# Altium footprint library 常用元件封装库.PcbLib: 1310 footprints (part 82 of 83)
Each footprint in its own frame and in the unit in brackets; x right, y up, seen from the top. Pads: shape width x height; smd on the part's side, far side on the other; paste and mask are expansions set on the pad; w line width, h text height; cw(c..) or ccw(c..) is an arc to the next point about the centre after c.
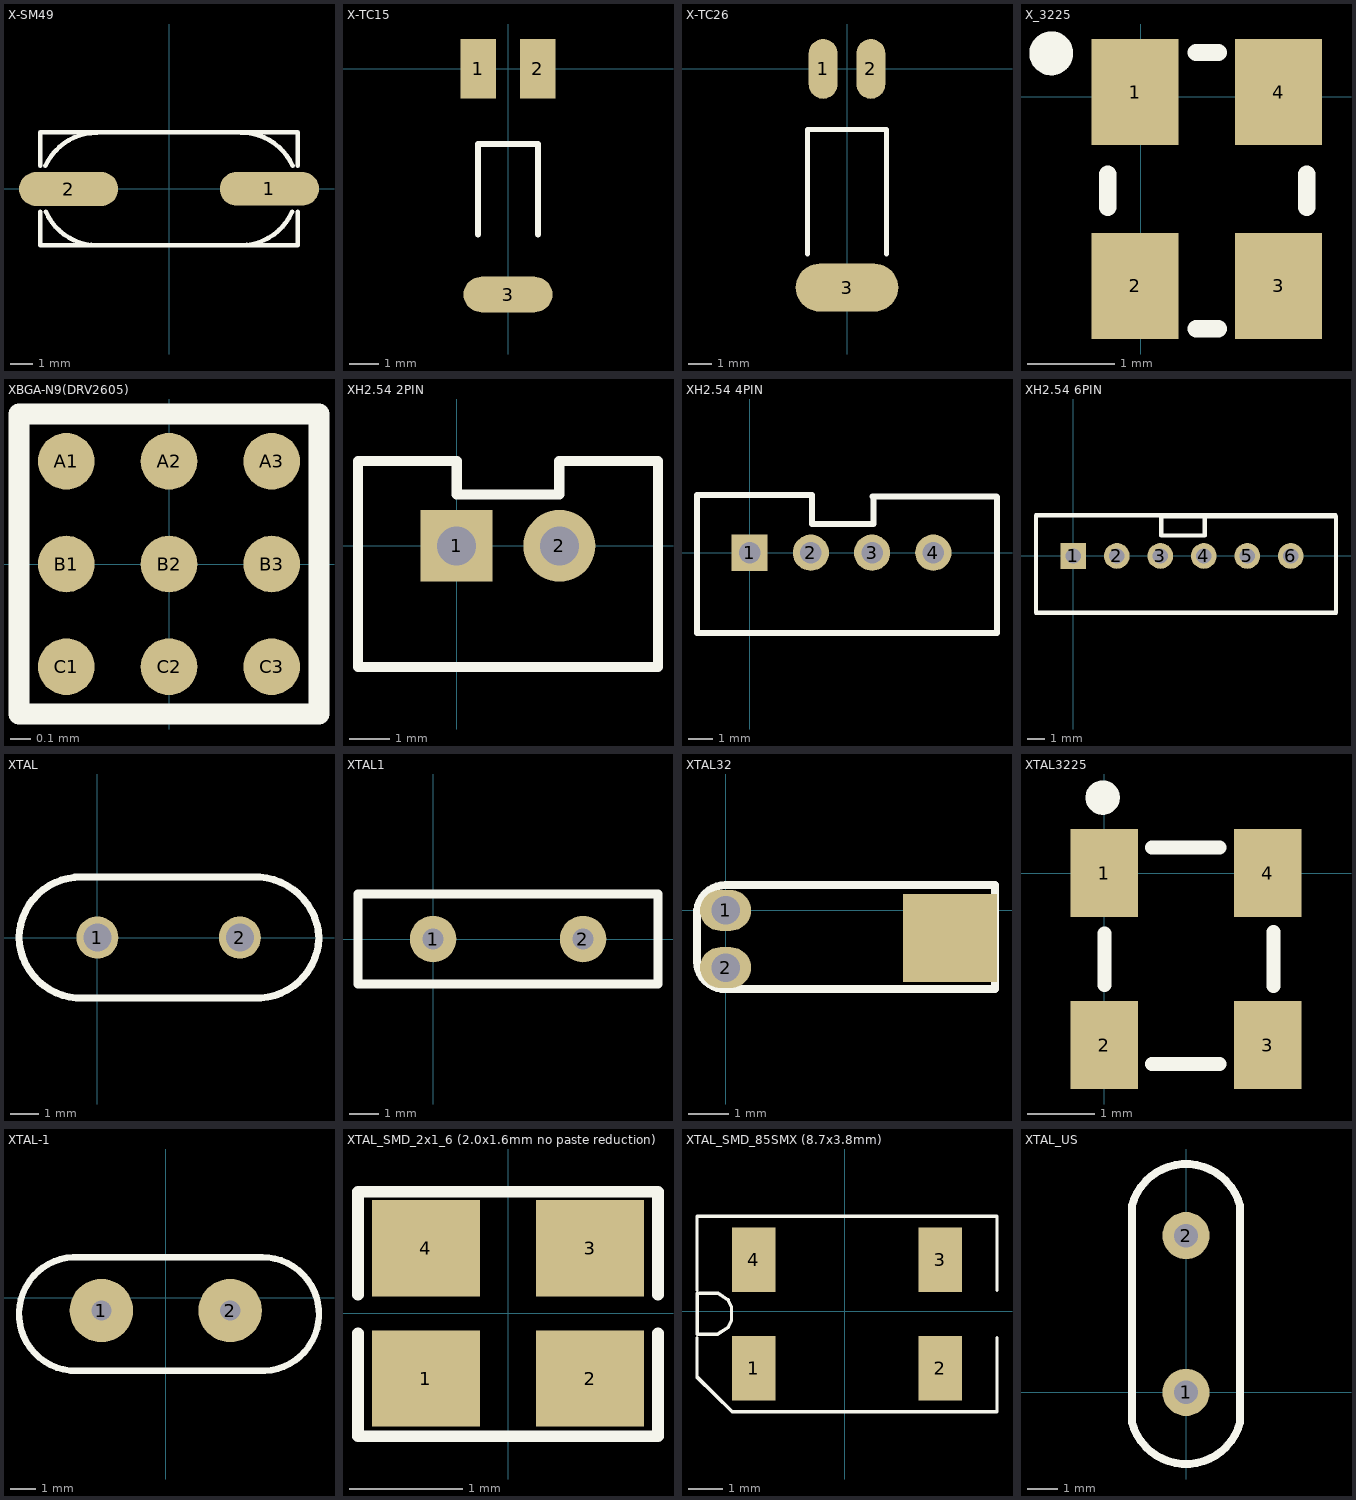
[diagram p81: the footprints below, top view; thin cyan lines are the x and y axes]

## X-SM49 [mm]
height 14.8
pads (2):
  oval 4.4x1.5 smd: 1(4.45,0.004) 2(-4.45,-0.004)
Top Overlay:
  lines w0.2: -5.7,-2.499 5.718,-2.499 ; -5.7,-2.496 -5.7,-1.016 ; -5.7,1.016 -5.7,2.504 5.718,2.504 5.718,1.016 ; -5.477,1.023 cw(c-3.202,-0.013) -3.175,2.487 ; -5.461,-1.016 ccw(c-3.176,-0.001) -3.176,-2.501 ; 3.175,-2.5 ccw(c3.175,0) 5.46,-1.015 ; 3.175,2.496 cw(c3.202,-0.004) 5.48,1.025 ; 5.718,-2.496 5.718,-1.016
3D body "User Library-HC-49S.STEP": height 4.3, standoff -0.05, extent -6.15,-2.35 6.15,2.35

## X-TC15 [mm] "圆柱晶振1"
pads (3):
  rect 1.2x2 smd: 1(-1,0) 2(1,0)
  oval 3x1.2 smd: 3(0,-7.62)
Top Overlay:
  lines w0.2: -1.016,-5.588 -1.016,-2.54 1.016,-2.54 1.016,-5.588
3D body: height 1.1, standoff 0.9, extent 0.535,-3 0.735,0
3D body: height 1.1, standoff 0.9, extent -0.735,-3 -0.535,0
3D body: height 1.99, standoff 0, extent -0.998,-8.286 0.998,-2.286

## X-TC26 [mm] "圆柱晶振2"
pads (3):
  oval 1.2x2.5 smd: 1(-1,0) 2(1,0)
  oval 4.3x2 smd: 3(0,-9.144)
Top Overlay:
  lines w0.2: -1.651,-7.747 -1.651,-2.54 1.651,-2.54 1.651,-7.747

## X_3225 [mil]
height 57.09
pads (4):
  rect 39.37x48 smd: 1(-2.6,2.09) 2(-2.6,-85.59) 3(62.36,-85.59) 4(62.36,2.09)
Top Overlay:
  circle w9.84: c-40.5,19.6 r5
  lines w7.87: -15,-50 -15,-35 ; 25,-105 35,-105 ; 25,20 35,20 ; 75,-50 75,-35

## XBGA-N9(DRV2605) [mm]
pads (9):
  round 0.275 smd: A1(-0.5,0.5) A2(0,0.5) A3(0.5,0.5) B1(-0.5,0) B2(0,0) B3(0.5,0) C1(-0.5,-0.5) C2(0,-0.5) C3(0.5,-0.5)
Top Overlay:
  lines w0.102: -0.73,-0.73 -0.73,0.73 0.73,0.73 0.73,-0.73 -0.73,-0.73

## XH2.54 2PIN [mil]
pads (2):
  rect 70x70 hole 38: 1(0,0)
  round 70 hole 38: 2(100,0)
Top Overlay:
  lines w10: 100,82.68 193,82.68 ; 100,82.68 100,50 0,50 0,82.68 -96.06,82.68 -96.06,-118.11 196.06,-118.11 196.06,82.68 ; 100,82.68 193,82.68 ; 193,82.68 196.06,82.68 ; 193,82.68 196.06,82.68
3D body "User Library-XH2_54_2PIN.STEP": height 275.59, standoff -157.48, extent -107.48,-122 207.48,114.22

## XH2.54 4PIN [mm]
pads (4):
  rect 1.5x1.5 hole 0.9: 1(0,0)
  round 1.5 hole 0.9: 2(2.54,0) 3(5.08,0) 4(7.62,0)
Top Overlay:
  lines w0.254: 5.105,2.329 7.468,2.329 ; 7.545,2.329 7.468,2.329 ; 10.236,2.329 7.468,2.329 ; 10.262,2.311 10.262,-3.327 -2.184,-3.327 -2.184,2.388 2.591,2.388 2.591,1.194 5.131,1.194 5.131,2.329 7.468,2.329
3D body "SW3dPS-jst-b4b-xh-a-1.STEP": height 7, standoff -3.4, extent -2.365,-3.459 10.035,2.291

## XH2.54 6PIN [mm]
pads (6):
  rect 1.5x1.5 hole 0.9: 1(0,0)
  round 1.5 hole 0.9: 2(2.54,0) 3(5.08,0) 4(7.62,0) 5(10.16,0) 6(12.7,0)
Top Overlay:
  lines w0.254: 2.896,-3.327 15.342,-3.327 15.342,2.311 ; 5.105,2.329 7.468,2.329 ; 5.131,2.388 5.131,1.194 7.671,1.194 7.671,2.329 ; 7.545,2.329 7.468,2.329 ; 10.185,2.329 12.548,2.329 ; 10.211,2.329 12.548,2.329 ; 10.236,2.329 7.468,2.329 ; 10.262,-3.327 -2.184,-3.327 -2.184,2.388 15.316,2.388 ; 12.625,2.329 12.548,2.329 ; 15.316,2.329 12.548,2.329
3D body "SW3dPS-jst-b4b-xh-a-1.STEP": height 7, standoff -3.4, extent -2.365,-3.459 10.035,2.291
3D body "SW3dPS-jst-b4b-xh-a-1.STEP": height 7, standoff -3.4, extent 2.715,-3.459 15.115,2.291

## XTAL [mm]
pads (2):
  round 1.5 hole 1.002: 1(0,0) 2(5.08,0)
Top Overlay:
  lines w0.254: -2.794,0 ccw(c-0.572,0.064) -0.508,-2.159 5.588,-2.159 ccw(c5.677,0.064) 7.899,-0.025 ccw(c5.626,-0.114) 5.537,2.159 -0.559,2.159 ccw(c-0.597,-0.038) -2.794,0

## XTAL1 [mil]
pads (2):
  round 62 hole 28: 1(0,0) 2(200,0)
Top Overlay:
  lines w12: -100,-60 -100,60 300,60 300,-60 -100,-60

## XTAL32 [mil]
pads (3):
  oval 50x40 hole 28: 1(0,0) 2(0,-56)
  rect 92.13x86 smd: ""(220,-27)
Top Overlay:
  lines w8: -28,-50 ccw(c-0.5,-49.5) 0,-77 264,-77 264,25 0,25 ccw(c0.5,-3.5) -28,-4 -28,-50

## XTAL3225 [mm]
pads (4):
  rect 1x1.3 smd: 1(0,0) 2(0,-2.54) 3(2.413,-2.54) 4(2.413,0)
Top Overlay:
  circle w0.254: c-0.025,1.118 r0.127
  lines w0.203: 0,-1.651 0,-0.889 ; 0.7,-2.819 1.7,-2.819 ; 0.7,0.381 1.7,0.381 ; 2.5,-1.669 2.5,-0.869

## XTAL-1 [mm]
pads (2):
  round 2.5 hole 0.8: 1(-2.54,-0.508) 2(2.54,-0.508)
Top Overlay:
  lines w0.254: -3.746,-2.887 3.654,-2.887 ccw(c3.8,-0.646) 3.8,1.6 -3.6,1.6 ; -3.546,-2.887 cw(c-3.546,-0.641) -3.4,1.6

## XTAL_SMD_2x1_6 (2.0x1.6mm no paste reduction) [mil]
pads (4):
  rect 37.5x33.5 smd: 1(-28.58,-22.72) 2(28.5,-22.72) 3(28.5,22.55) 4(-28.58,22.55)
Top Overlay:
  lines w4: -52.2,-6.98 -52.2,-42.8 52.13,-42.8 52.13,-6.98 ; -52.2,6.46 -52.2,42.24 52.13,42.24 52.13,6.46

## XTAL_SMD_85SMX (8.7x3.8mm) [mil]
pads (4):
  rect 50x74 smd: 1(-104.8,-65.42) 2(110.2,-65.42) 3(110.2,59.58) 4(-104.8,59.58)
Top Overlay:
  lines w4: -169.8,-30.42 -169.8,-75.42 -129.21,-115.42 175.2,-115.42 175.2,-30.42 ; -169.8,24.58 -169.8,109.58 175.2,109.58 175.2,24.58 ; -169.48,-26.09 -145.86,-26.09 -134.05,-18.21 -130.11,-10.34 -130.11,5.41 -134.05,13.28 -145.86,21.16 -169.48,21.16 -169.48,-26.09

## XTAL_US [mil]
pads (2):
  round 60 hole 30: 1(0,0) 2(0,200)
Top Overlay:
  lines w10: -68.9,-37.8 ccw(c0,-20) 68.9,-37.8 68.9,237.79 ccw(c0,220) -68.9,237.8 -68.9,-37.8
3D body "User Library-HC-49_LT_THT_16MHz.STEP": height 141.73, standoff -78.35, extent -90.54,-122.42 92.53,324.43